# Altium footprint library M_Derogarian Altium Library.PcbLib: 137 footprints (part 2 of 9)
Each footprint in its own frame and in the unit in brackets; x right, y up, seen from the top. Pads: shape width x height; smd on the part's side, far side on the other; paste and mask are expansions set on the pad; w line width, h text height; cw(c..) or ccw(c..) is an arc to the next point about the centre after c.
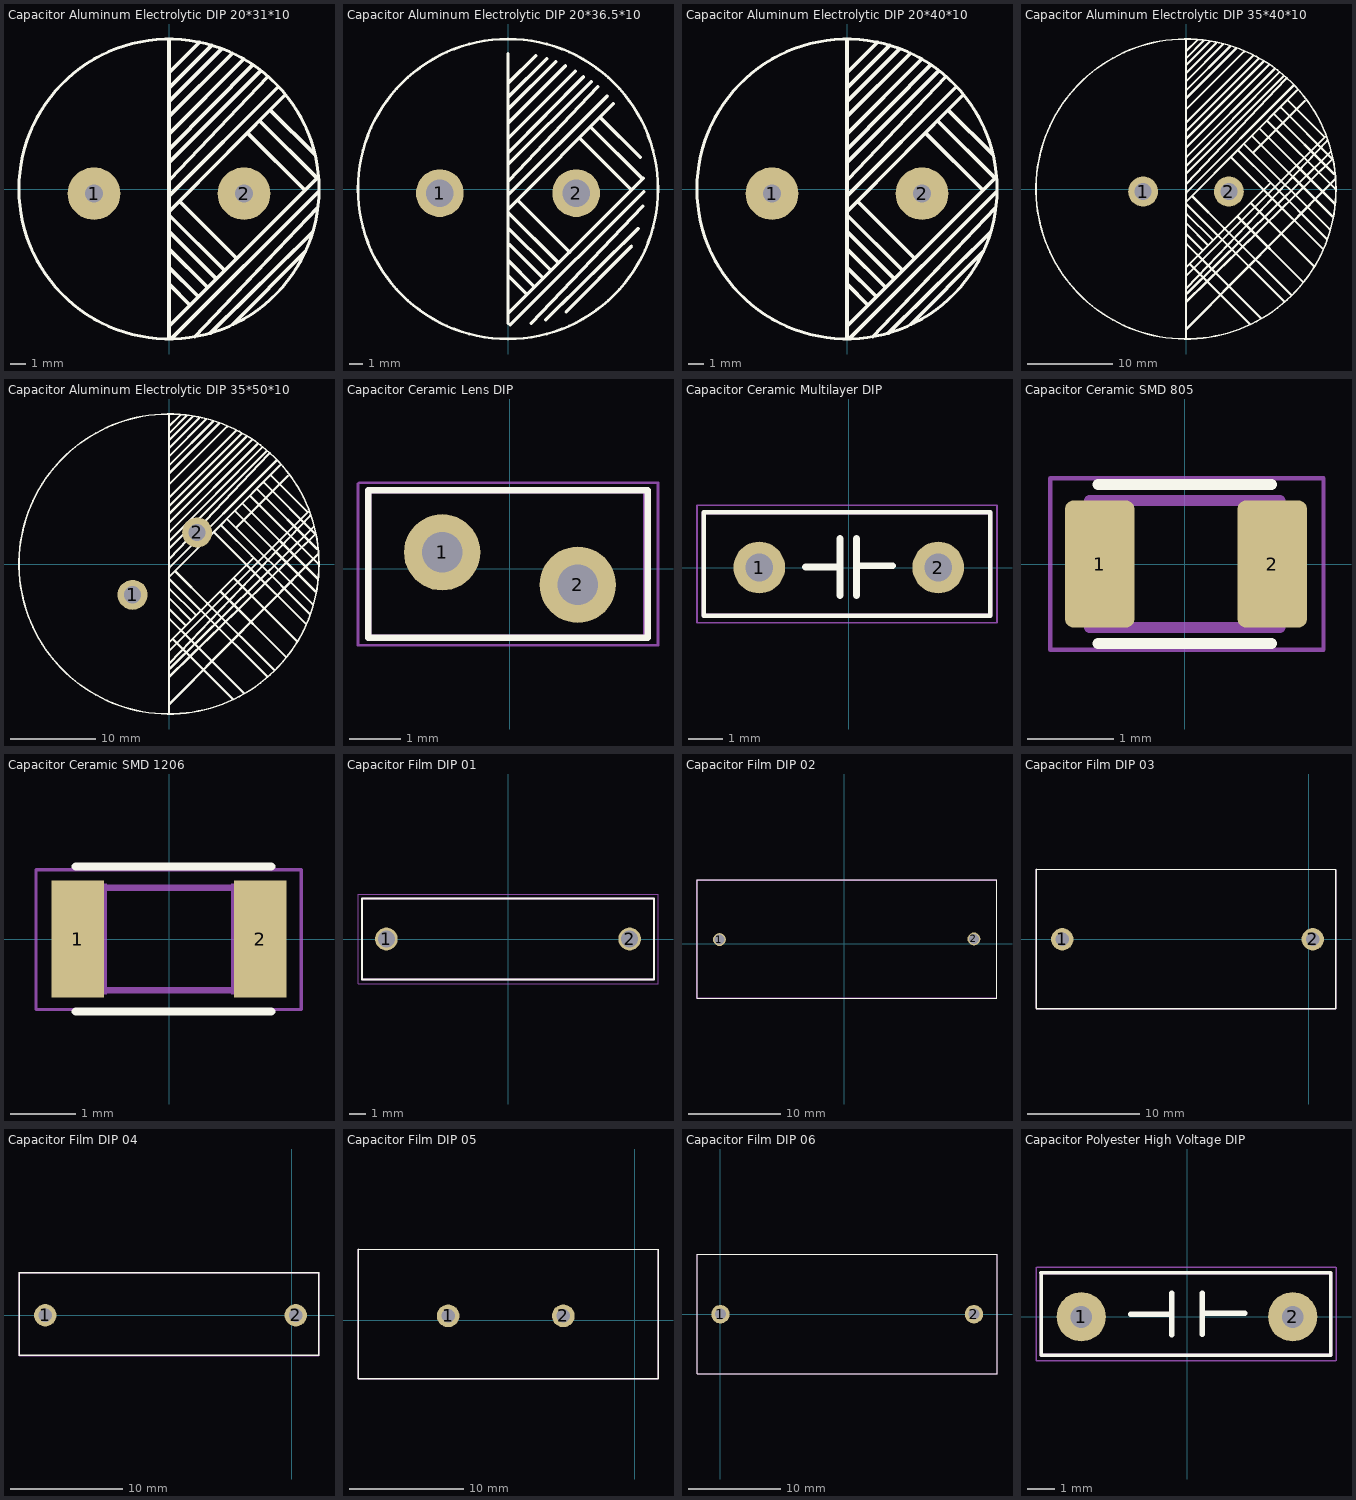
[diagram p1: the footprints below, top view; thin cyan lines are the x and y axes]

## Capacitor Aluminum Electrolytic DIP 20*31*10 [mm]
height 12
pads (2):
  round 3.5 hole 1.2: 1(-5,-0.305) 2(5,-0.305)
Top Overlay:
  circle w0.2: c0,0 r10
  lines w0.25: 0,-5.232 1.858,-7.083 ; 0,4.826 4.216,9.042 ; 0,5.842 3.492,9.335 ; 0,6.731 2.832,9.563 ; 0,7.747 2.032,9.779 ; 0.025,-9.119 9.931,0.787 ; 0.025,-6.375 1.375,-7.719 ; 0.025,-2.87 3.105,-5.937 ; 0.025,-0.432 7.277,6.82 ; 0.025,3.708 4.94,8.623 ; 0.051,-1.778 3.678,-5.391 ; 0.052,0.613 6.581,7.491 ; 0.064,1.841 6.096,7.874 ; 0.063,2.706 5.538,8.229 ; 0.076,-4.064 2.507,-6.485 ; 0.079,-1.425 7.722,6.248 ; 0.165,-9.97 9.944,-0.191 ; 0.813,-0.94 4.516,-4.628 ; 1.716,-9.844 9.881,-1.27 ; 2.763,-9.595 9.55,-2.896 ; 4.267,-9.017 9.059,-4.182 ; 5.258,3.708 9.05,-0.069 ; 6.071,4.521 9.875,0.732 ; 6.807,5.207 9.696,2.33
  lines w0.254: 0,-9.83 0,9.931 ; 0,6.909 0,7.544
3D body "User Library-CAPAER_D200_L310_P100_W010X030.STEP": height 31.01, standoff -3, extent -10.231,-10.109 9.779,9.891

## Capacitor Aluminum Electrolytic DIP 20*36.5*10 [mm]
height 12
pads (2):
  round 3.5 hole 2: 1(-5,-0.305) 2(5,-0.305)
Top Overlay:
  circle w0.2: c0,0 r11
  lines w0.25: 0,-5.232 1.858,-7.083 ; 0,4.826 4.216,9.042 ; 0,5.842 3.492,9.335 ; 0,6.731 2.832,9.563 ; 0,7.747 2.032,9.779 ; 0.025,-9.119 9.931,0.787 ; 0.025,-6.375 1.375,-7.719 ; 0.025,-2.87 3.105,-5.937 ; 0.025,-0.432 7.277,6.82 ; 0.025,3.708 4.94,8.623 ; 0.051,-1.778 3.678,-5.391 ; 0.052,0.613 6.581,7.491 ; 0.064,1.841 6.096,7.874 ; 0.063,2.706 5.538,8.229 ; 0.076,-4.064 2.507,-6.485 ; 0.079,-1.425 7.722,6.248 ; 0.165,-9.97 9.944,-0.191 ; 0.813,-0.94 4.516,-4.628 ; 1.716,-9.844 9.881,-1.27 ; 2.763,-9.595 9.55,-2.896 ; 4.267,-9.017 9.059,-4.182 ; 5.258,3.708 9.05,-0.069 ; 6.071,4.521 9.875,0.732 ; 6.807,5.207 9.696,2.33
  lines w0.254: 0,-9.83 0,9.931 ; 0,6.909 0,7.544
3D body "User Library-CAPAER_D200_L350_P100_W010X030.STEP": height 2, standoff -36.01, extent -9.847,-10.33 10.163,9.67

## Capacitor Aluminum Electrolytic DIP 20*40*10 [mm]
height 12
pads (2):
  round 3.5 hole 1.2: 1(-5,-0.305) 2(5,-0.305)
Top Overlay:
  circle w0.2: c0,0 r10
  lines w0.25: 0,-5.232 1.858,-7.083 ; 0,4.826 4.216,9.042 ; 0,5.842 3.492,9.335 ; 0,6.731 2.832,9.563 ; 0,7.747 2.032,9.779 ; 0.025,-9.119 9.931,0.787 ; 0.025,-6.375 1.375,-7.719 ; 0.025,-2.87 3.105,-5.937 ; 0.025,-0.432 7.277,6.82 ; 0.025,3.708 4.94,8.623 ; 0.051,-1.778 3.678,-5.391 ; 0.052,0.613 6.581,7.491 ; 0.064,1.841 6.096,7.874 ; 0.063,2.706 5.538,8.229 ; 0.076,-4.064 2.507,-6.485 ; 0.079,-1.425 7.722,6.248 ; 0.165,-9.97 9.944,-0.191 ; 0.813,-0.94 4.516,-4.628 ; 1.716,-9.844 9.881,-1.27 ; 2.763,-9.595 9.55,-2.896 ; 4.267,-9.017 9.059,-4.182 ; 5.258,3.708 9.05,-0.069 ; 6.071,4.521 9.875,0.732 ; 6.807,5.207 9.696,2.33
  lines w0.254: 0,-9.83 0,9.931 ; 0,6.909 0,7.544
3D body "User Library-CAPAER_D200_L400_P100_W010X030.STEP": height 40.01, standoff -3, extent -9.945,-10.278 10.065,9.723

## Capacitor Aluminum Electrolytic DIP 35*40*10 [mm]
height 12
pads (2):
  round 3.5 hole 2: 1(-5,-0.305) 2(5,-0.305)
Top Overlay:
  circle w0.2: c0,0 r17.5
  lines w0.25: 0,-5.232 1.858,-7.083 ; 0,4.826 9.696,14.522 ; 0,5.842 9.039,14.881 ; 0,6.731 8.493,15.224 ; 0,7.747 7.816,15.563 ; 0,16.072 1.298,17.37 ; 0.025,-9.119 9.868,0.724 6.071,4.521 ; 0.025,-6.375 1.375,-7.719 ; 0.025,-2.87 3.105,-5.937 ; 0.025,-0.432 12.537,12.08 ; 0.025,3.708 10.316,13.999 ; 0.031,-10.104 16.188,6.054 11.888,10.354 ; 0.048,11.532 5.14,16.625 ; 0.051,-11.592 16.467,5.647 ; 0.051,-1.778 3.678,-5.391 ; 0.052,0.613 11.655,12.838 ; 0.057,-13.126 17.067,3.477 ; 0.059,-16.337 17.378,1.135 ; 0.06,13.577 3.504,17.021 ; 0.062,14.481 2.803,17.222 ; 0.062,10.617 5.839,16.394 ; 0.064,1.841 11.367,13.145 ; 0.063,2.706 10.836,13.574 ; 0.075,15.307 2.107,17.339 ; 0.076,-4.064 2.507,-6.485 ; 0.078,9.347 6.734,16.003 ; 0.079,-1.425 12.959,11.506 ; 0.092,12.642 4.32,16.87 ; 0.125,-12.199 16.875,4.334 ; 0.408,-8.734 7.46,-15.785 ; 0.813,-0.94 4.516,-4.628 ; 1.306,-7.644 8.717,-15.055 ; 3.763,-5.446 11.482,-13.165 ; 4.468,-4.574 12.266,-12.371 ; 5.258,3.708 9.05,-0.069 ; 6.003,-3.201 13.67,-10.868 ; 6.807,5.207 16.765,-4.712 ; 7.548,-1.634 14.881,-8.966 ; 7.741,6.146 17.087,-3.2 ; 7.915,4.32 13.88,10.285 ; 8.588,7.039 17.317,-1.69 ; 8.968,0.009 15.967,-6.99 ; 9.503,7.909 17.455,-0.043 ; 9.648,0.949 16.424,-5.827 ; 10.281,8.731 17.271,1.741 ; 11.096,9.466 17.053,3.509
  lines w0.254: 0,-17.333 0,17.383 ; 0,6.909 0,7.544
3D body "User Library-part1-165.STEP": height 40.2, standoff -3.24, extent -17.477,-17.932 17.541,17.068

## Capacitor Aluminum Electrolytic DIP 35*50*10 [mm]
height 12
pads (2):
  round 3.5 hole 2: 1(-4.245,-3.592) 2(3.285,3.688)
Top Overlay:
  circle w0.2: c0,0 r17.5
  lines w0.25: 0,-5.232 1.858,-7.083 ; 0,4.826 9.696,14.522 ; 0,5.842 9.039,14.881 ; 0,6.731 8.493,15.224 ; 0,7.747 7.816,15.563 ; 0,16.072 1.298,17.37 ; 0.025,-9.119 9.868,0.724 6.071,4.521 ; 0.025,-6.375 1.375,-7.719 ; 0.025,-2.87 3.105,-5.937 ; 0.025,-0.432 12.537,12.08 ; 0.025,3.708 10.316,13.999 ; 0.031,-10.104 16.188,6.054 11.888,10.354 ; 0.048,11.532 5.14,16.625 ; 0.051,-11.592 16.467,5.647 ; 0.051,-1.778 3.678,-5.391 ; 0.052,0.613 11.655,12.838 ; 0.057,-13.126 17.067,3.477 ; 0.059,-16.337 17.378,1.135 ; 0.06,13.577 3.504,17.021 ; 0.062,14.481 2.803,17.222 ; 0.062,10.617 5.839,16.394 ; 0.064,1.841 11.367,13.145 ; 0.063,2.706 10.836,13.574 ; 0.075,15.307 2.107,17.339 ; 0.076,-4.064 2.507,-6.485 ; 0.078,9.347 6.734,16.003 ; 0.079,-1.425 12.959,11.506 ; 0.092,12.642 4.32,16.87 ; 0.125,-12.199 16.875,4.334 ; 0.408,-8.734 7.46,-15.785 ; 0.813,-0.94 4.516,-4.628 ; 1.306,-7.644 8.717,-15.055 ; 3.763,-5.446 11.482,-13.165 ; 4.468,-4.574 12.266,-12.371 ; 5.258,3.708 9.05,-0.069 ; 6.003,-3.201 13.67,-10.868 ; 6.807,5.207 16.765,-4.712 ; 7.548,-1.634 14.881,-8.966 ; 7.741,6.146 17.087,-3.2 ; 7.915,4.32 13.88,10.285 ; 8.588,7.039 17.317,-1.69 ; 8.968,0.009 15.967,-6.99 ; 9.503,7.909 17.455,-0.043 ; 9.648,0.949 16.424,-5.827 ; 10.281,8.731 17.271,1.741 ; 11.096,9.466 17.053,3.509
  lines w0.254: 0,-17.333 0,17.383 ; 0,6.909 0,7.544
3D body "alc40a471dh450.stp": height 6.29, standoff -63, extent -18.587,-18.028 17.413,17.973

## Capacitor Ceramic Lens DIP [mm]
pads (2):
  round 1.5 hole 0.8: 1(-1.333,0.318) 2(1.333,-0.318)
Top Overlay:
  lines w0.127: -2.787,1.543 -2.787,-1.359 2.706,-1.359 2.706,1.537 -2.781,1.537
Mechanical 13:
  lines w0.127: -2.787,-1.359 2.68,-1.359 2.68,1.537 -2.787,1.537 -2.787,-1.359
Mechanical 15:
  lines w0.05: -2.987,1.664 -2.987,-1.511 2.909,-1.511 2.909,1.69 -2.957,1.688
3D body "User Library-Cer-Cap2 (3_5x1_5).STEP": height 4.5, standoff -2, extent -1.66,-0.853 1.84,0.648

## Capacitor Ceramic Multilayer DIP [mm]
pads (2):
  round 1.5 hole 0.8: 1(-2.594,0) 2(2.594,0)
Top Overlay:
  lines w0.127: -4.198,-1.398 -4.198,1.602 4.094,1.602 ; -4.194,-1.398 4.094,-1.398 ; 4.097,-1.398 4.097,1.602
  lines w0.2: -1.254,0.013 -0.254,0.013 ; -0.254,-0.813 -0.254,0.838 ; 0.229,-0.813 0.229,0.838 ; 0.27,0.051 1.27,0.051
Mechanical 13:
  lines w0.127: 4.094,-1.398 -4.198,-1.398 -4.198,1.596 -4.194,1.6 4.094,1.6 ; 4.097,-1.398 4.097,1.6
Mechanical 15:
  lines w0.05: -4.398,1.802 -4.398,-1.598 4.29,-1.598 ; -4.397,1.802 4.29,1.803 ; 4.297,-1.598 4.297,1.802
3D body "c322c104k5r5ta.stp": height 7.31, standoff -6.29, extent -2.67,-1.51 2.92,1.675

## Capacitor Ceramic SMD 805 [mm]
pads (2):
  rrect25% 0.8x1.47 smd: 1(-0.98,0) 2(1.01,0)
Top Overlay:
  lines w0.127: -1,-0.915 1,-0.915 ; -1,0.915 1,0.915
Mechanical 13:
  lines w0: -0.356,-0.737 0.356,-0.737
  lines w0.127: -1.1,-0.73 -1.1,0.73 1.1,0.73 1.1,-0.73 -1.1,-0.73
Mechanical 15:
  lines w0.05: -1.55,-0.99 -1.55,0.99 1.6,0.99 1.6,-0.99 -1.55,-0.99
3D body "C0805C102K1RACTU.STEP": height 1.23, standoff -0.04, extent -0.94,-0.686 1.092,0.711

## Capacitor Ceramic SMD 1206 [mm]
pads (2):
  rect 0.8x1.8 smd: 1(-1.4,0) 2(1.4,0)
Top Overlay:
  lines w0.127: -1.43,-1.11 1.57,-1.11 ; -1.43,1.11 1.57,1.11
Mechanical 13:
  region: -0.952,-0.851 -1.702,-0.851 -1.702,0.849 -0.952,0.849
  region: 1.702,-0.849 0.952,-0.849 0.952,0.851 1.702,0.851
  lines w0.102: -0.965,-0.787 0.965,-0.787 ; -0.965,0.787 0.965,0.787
Mechanical 15:
  lines w0.051: -2.04,-1.08 2.03,-1.08 2.03,1.06 -2.04,1.06 -2.04,-1.08
3D body "c1206c101j5gactu.stp": height 0.87, standoff -0.01, extent -1.7,-0.9 1.7,0.9

## Capacitor Film DIP 01 [mm]
pads (2):
  round 1.4 hole 1.05: 1(-7.5,0) 2(7.5,0)
Top Overlay:
  lines w0.127: -9,-2.5 -9,2.5 9,2.5 9,-2.5 -9,-2.5
Mechanical 13:
  lines w0.127: -9,-2.5 9,-2.5 9,2.5 -9,2.5 -9,-2.5
Mechanical 15:
  lines w0.05: -9.25,-2.75 9.25,-2.75 9.25,2.75 -9.25,2.75 -9.25,-2.75
3D body "B32922C3104K289.STEP": height 10.5, standoff -6, extent -8.978,-2.478 9.022,2.522

## Capacitor Film DIP 02 [mm]
pads (2):
  round 1.4 hole 1.05: 1(-13.5,0.433) 2(14.015,0.495)
Top Overlay:
  lines w0.127: -15.925,-5.89 16.498,-5.89 16.498,6.87 -15.925,6.87 -15.925,-5.89
Mechanical 13:
  lines w0.127: -15.927,-5.893 16.495,-5.893 16.495,6.867 -15.927,6.867 -15.927,-5.893
Mechanical 15:
  lines w0.05: -15.915,-5.867 -15.915,6.873 16.505,6.873 16.505,-5.867 -15.915,-5.867
3D body "User Library-JFB02J105.STEP": height 23.5, standoff -5, extent -15.783,-5.787 16.217,6.713

## Capacitor Film DIP 03 [mm]
pads (2):
  round 2 hole 1.2: 1(-22,0) 2(0.375,0)
Top Overlay:
  lines w0.127: -24.348,-6.19 2.425,-6.19 ; -24.348,-6.172 -24.348,6.243 ; -24.337,6.243 2.45,6.225 2.45,-6.192
Mechanical 13:
  lines w0.127: -24.35,6.241 2.45,6.225 2.45,-6.192 -24.35,-6.192 -24.35,6.248
Mechanical 15:
  lines w0.05: -24.348,-6.167 2.425,-6.167 ; -24.338,-6.15 -24.338,6.248 2.45,6.248 ; 2.45,-6.192 2.45,6.225
3D body "User Library-ECQ-E2475JF_Film_Capacitor_26x12x21,5.sldprt": height 23.1, standoff -4.9, extent -23.875,-6 2.125,6

## Capacitor Film DIP 04 [mm]
pads (2):
  round 2 hole 1.2: 1(-22,0) 2(0.375,0)
Top Overlay:
  lines w0.127: -24.348,-3.592 -24.348,3.823 ; -24.348,-3.59 2.425,-3.59 ; -24.337,3.818 2.45,3.8 ; 2.45,-3.592 2.45,3.823
Mechanical 13:
  lines w0.127: -24.35,-3.592 2.45,-3.592 2.45,3.8 2.45,3.816 -24.35,3.816 -24.35,-3.592
Mechanical 15:
  lines w0.05: -24.348,-3.567 2.425,-3.567 ; -24.338,-3.567 -24.338,3.816 ; -24.338,3.823 2.45,3.823 ; 2.45,-3.592 2.45,3.8
3D body "User Library-FILM_BLUE_P2250L2650W700H1600PD80.STEP": height 16, standoff -5, extent -24.275,-3.4 2.225,3.6

## Capacitor Film DIP 05 [mm]
pads (2):
  round 2 hole 1.2: 1(-16.425,0.4) 2(-6.3,0.4)
Top Overlay:
  lines w0.127: -24.348,-5.092 -24.348,6.243 ; -24.338,-5.092 -24.315,-5.115 2.025,-5.115 2.025,6.248 ; -24.337,6.243 2.025,6.225
Mechanical 13:
  lines w0.127: -24.35,-5.092 -24.35,6.248 ; -24.35,6.241 2.025,6.225 ; -24.338,-5.092 -24.313,-5.117 2.025,-5.117 ; 2.025,-5.125 2.025,6.248
Mechanical 15:
  lines w0.05: -24.35,-5.092 2.025,-5.092 2.025,6.248 -24.338,6.248 -24.338,-5.115
3D body "User Library-CAPF-R-K71-7-S10_0-L26W10_0H19_0.sldprt": height 19, standoff -5, extent -24.325,-4.65 1.675,5.36

## Capacitor Film DIP 06 [mm]
pads (2):
  round 2 hole 1.2: 1(0,0) 2(27.5,0)
Top Overlay:
  lines w0.127: -2.54,-6.475 -2.54,6.522 30,6.5 30,-6.475 -2.54,-6.475
Mechanical 13:
  lines w0.127: -2.54,-6.475 30,-6.475 30,6.5 -2.54,6.519 -2.54,-0.17 -2.54,-6.475
Mechanical 15:
  lines w0.05: -2.54,-6.475 -2.54,6.5 30,6.5 30,-6.475 -2.54,-6.475
3D body "User Library-FILM_GREY_P2750L3150W1250H2150PD90.STEP": height 21.5, standoff -5, extent -2.025,-6.2 29.475,6.3

## Capacitor Polyester High Voltage DIP [mm]
pads (2):
  round 1.8 hole 0.8: 1(-3.861,0) 2(3.861,0)
Top Overlay:
  lines w0.127: -5.333,1.602 5.238,1.602 ; -5.315,1.602 -5.315,-1.398 5.238,-1.398 ; 5.241,-1.398 5.241,1.602
  lines w0.2: -2.059,0.102 -0.559,0.102 ; -0.559,-0.648 -0.559,0.852 ; 0.559,-0.636 0.559,0.864 ; 0.608,0.127 2.108,0.127
Mechanical 13:
  lines w0.127: -5.315,-1.398 -5.315,1.596 -5.31,1.6 ; -5.307,-1.398 5.238,-1.398 ; -5.282,1.6 5.238,1.6 ; 5.241,-1.398 5.241,1.6
Mechanical 15:
  lines w0.05: -5.515,-1.598 -5.515,1.802 ; -5.51,-1.598 5.434,-1.598 ; -5.485,1.801 5.434,1.803 ; 5.441,-1.598 5.441,1.802
3D body "User Library-D6x7_5.STEP": height 9, standoff -2, extent -4.049,-1.578 4.051,1.422